# Altium integrated library 集成库Integrated_Library1.IntLib: 86 symbols
Pins are listed as number, name and electrical type; pins without a type are passive.

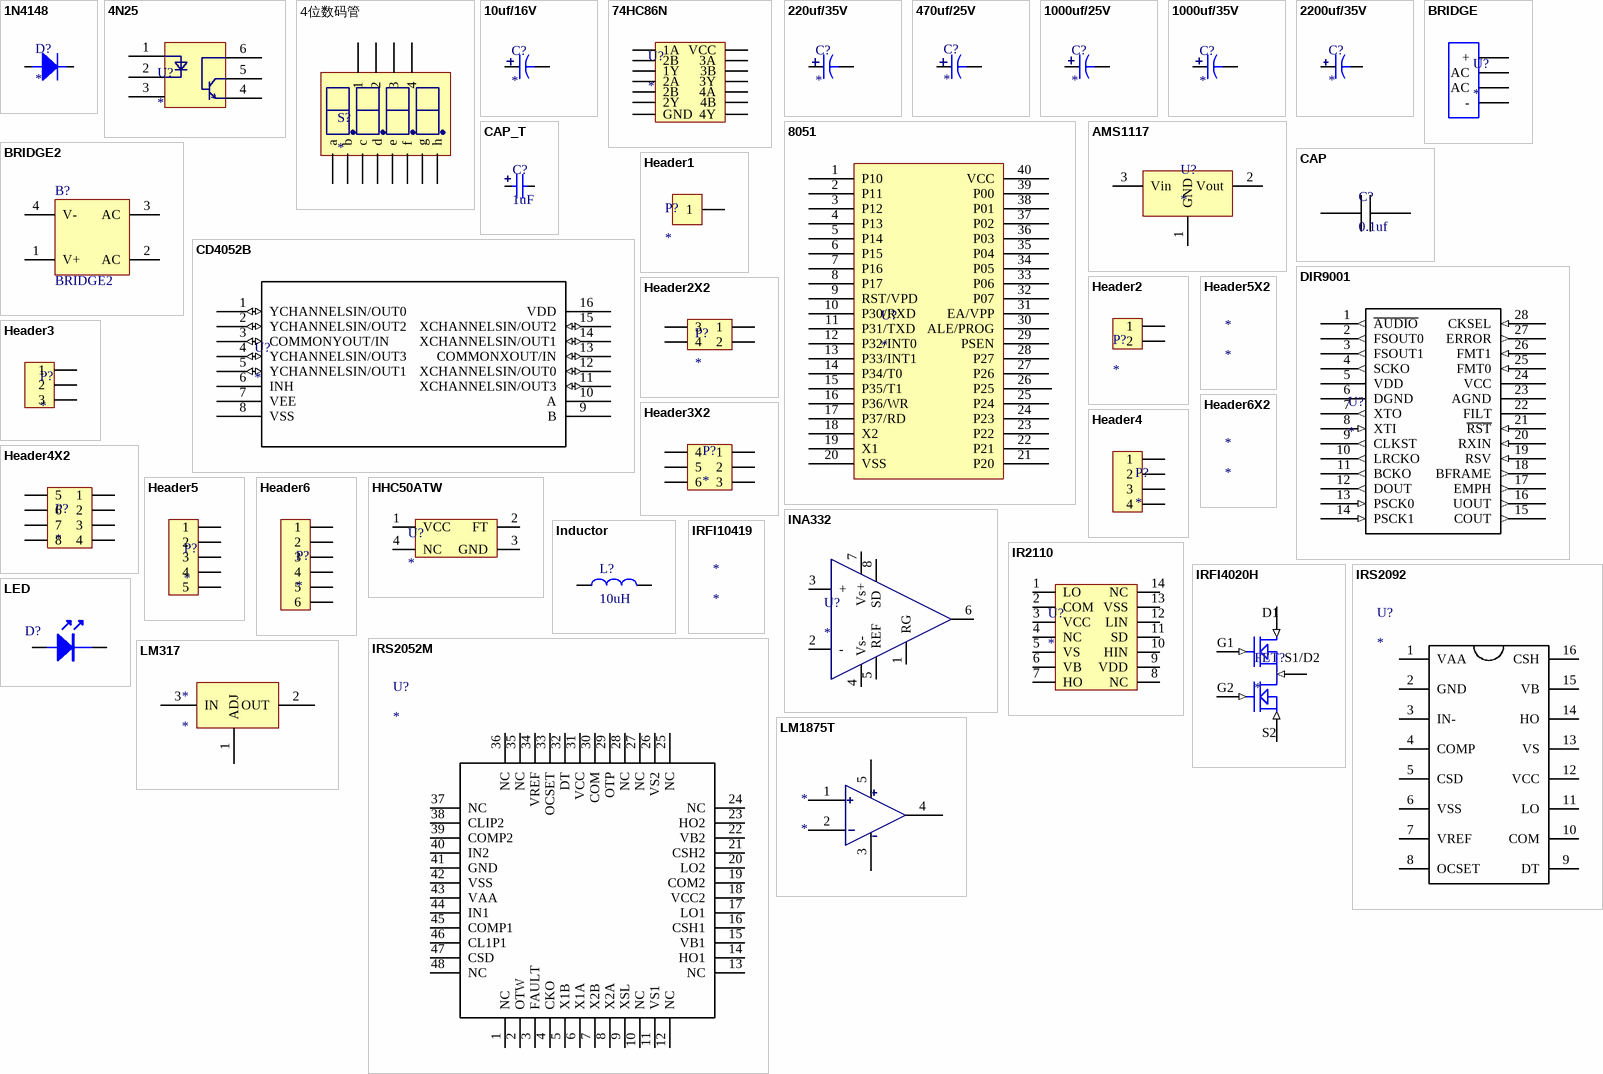
[diagram p0: symbols 1N4148 to LM1875T]

## 1N4148
designator D?
footprint DIODE
pins: 1 A, 2 K

## 4N25
designator U?
footprint 4N25 - duplicate
pins: 1, 2, 3, 4, 5, 6

## 4位数码管
designator S?
footprint 4位数码管
pins: 1, 2 a, 3 f, 4 2, 5 3, 6 b, 7 4, 8 g, 9 c, 10 h, 11 d, 12 e

## 10uf/16V
designator C?
footprint 100uf/35V
3D model 电解电容__深绿__零件72 (PCB3D Model)
pins: 1, 2

## 74HC86N
designator U?
footprint 74HC86N-DIP14
pins: 1 1A, 2 2B, 3 1Y, 4 2A, 5 2B, 6 2Y, 7 GND, 8 4Y, 9 4B, 10 4A, 11 3Y, 12 3B, 13 3A, 14 VCC

## 220uf/35V
designator C?
footprint 100uf/35V
pins: 1, 2

## 470uf/25V
designator C?
footprint 470uf/25V
pins: 1, 2

## 1000uf/25V
designator C?
footprint 1000uf/35V
pins: 1, 2

## 1000uf/35V
designator C?
footprint 1000uf/35V
pins: 1, 2

## 2200uf/35V
designator C?
footprint 2200uf/35V
pins: 1, 2

## 8051
designator U?
footprint 80C51
pins: 1 P10, 2 P11, 3 P12, 4 P13, 5 P14, 6 P15, 7 P16, 8 P17, 9 RST/VPD, 10 P30/RXD, 11 P31/TXD, 12 P32/INT0, 13 P33/INT1, 14 P34/T0, 15 P35/T1, 16 P36/WR, 17 P37/RD, 18 X2, 19 X1, 20 VSS, 21 P20, 22 P21, 23 P22, 24 P23, 25 P24, 26 P25, 27 P26, 28 P27, 29 PSEN, 30 ALE/PROG, 31 EA/VPP, 32 P07, 33 P06, 34 P05, 35 P04, 36 P03, 37 P02, 38 P01, 39 P00, 40 VCC

## AMS1117
designator U?
3.3V电压转换器AMS1117
footprint ASM1117
pins: 1 GND, 2 Vout, 3 Vin

## BRIDGE
designator U?
pins: 1 AC, 2 AC, 3 +, 4 -

## BRIDGE2
designator B?
Diode Bridge
footprint BRIDGE
pins: 1 V+, 2 AC, 3 AC, 4 V-
2 alternate drawings of the same symbol

## CAP
designator C?, comment 0.1uf
value: 0.1uf
footprint 0805-CAP
footprint 0603-cap
pins: 1, 2

## CAP_T
designator C?, comment 1uF
footprint CAP-C
footprint CAP-C
footprint CAP-A
pins: 1, 2

## CD4052B
designator U?
footprint D16-M
pins: 1 YCHANNELSIN/OUT0 (io), 2 YCHANNELSIN/OUT2 (io), 3 COMMONYOUT/IN (io), 4 YCHANNELSIN/OUT3 (io), 5 YCHANNELSIN/OUT1 (io), 6 INH, 7 VEE (power), 8 VSS (power), 9 B, 10 A, 11 XCHANNELSIN/OUT3 (io), 12 XCHANNELSIN/OUT0 (io), 13 COMMONXOUT/IN (io), 14 XCHANNELSIN/OUT1 (io), 15 XCHANNELSIN/OUT2 (io), 16 VDD (power)

## DIR9001
designator U?
footprint PW28
pins: 1 ~{AUDIO} (out), 2 FSOUT0 (out), 3 FSOUT1 (out), 4 SCKO (out), 5 VDD (power), 6 DGND (power), 7 XTO (out), 8 XTI (in), 9 CLKST (out), 10 LRCKO (out), 11 BCKO (out), 12 DOUT (out), 13 PSCK0 (in), 14 PSCK1 (in), 15 COUT (out), 16 UOUT (out), 17 EMPH (out), 18 BFRAME (out), 19 RSV (in), 20 RXIN (in), 21 ~{RST} (in), 22 FILT, 23 AGND (power), 24 VCC (power), 25 FMT0 (in), 26 FMT1 (in), 27 ERROR (out), 28 CKSEL (in)

## Header1
designator P?
pins: 1

## Header2
designator P?
footprint header2
pins: 1, 2

## Header2X2
designator P?
footprint header2x2
pins: 1, 2, 3, 4

## Header3
designator P?
footprint header3
pins: 1, 2, 3

## Header3X2
designator P?
footprint header2x3
pins: 1, 2, 3, 4, 5, 6

## Header4
designator P?
footprint header4
pins: 1, 2, 3, 4

## Header4X2
designator P?
footprint HEADER2X4
pins: 1, 2, 3, 4, 5, 6, 7, 8

## Header5
designator P?
footprint header5
pins: 1, 2, 3, 4, 5

## Header5X2
designator *

## Header6
designator P?
footprint Header6
pins: 1, 2, 3, 4, 5, 6

## Header6X2
designator *

## HHC50ATW
designator U?
footprint 24.576M
pins: 1 VCC, 2 FT, 3 GND, 4 NC

## INA332
designator U?
footprint DGK8
pins: 1 RG, 2 -, 3 +, 4 Vs-, 5 REF, 6, 7 Vs+, 8 SD

## Inductor
designator L?, comment 10uH
footprint 0805L
footprint 0603_L
footprint 7G17A
pins: 1, 2

## IR2110
designator U?
footprint Model Name (Model Description)
footprint IR2110-DIP
pins: 1 LO, 2 COM, 3 VCC, 4 NC, 5 VS, 6 VB, 7 HO, 8 NC, 9 VDD, 10 HIN, 11 SD, 12 LIN, 13 VSS, 14 NC

## IRFI4020H
designator FET?
footprint IRFI14020H-117P
pins: 1 G2 (in), 2 G1 (in), 3 S2 (in), 4 S1/D1 (in), 5 D1 (in)
text: S1/D2

## IRFI10419
designator *

## IRS2052M
designator U?
pins: 1 NC, 2 OTW, 3 FAULT, 4 CKO, 5 X1B, 6 X1A, 7 X2B, 8 X2A, 9 XSL, 10 NC, 11 VS1, 12 NC, 13 NC, 14 HO1, 15 VB1, 16 CSH1, 17 LO1, 18 VCC2, 19 COM2, 20 LO2, 21 CSH2, 22 VB2, 23 HO2, 24 NC, 25 NC, 26 VS2, 27 NC, 28 NC, 29 OTP, 30 COM, 31 VCC, 32 DT, 33 OCSET, 34 VREF, 35 NC, 36 NC, 37 NC, 38 CLIP2, 39 COMP2, 40 IN2, 41 GND, 42 VSS, 43 VAA, 44 IN1, 45 COMP1, 46 CL1P1, 47 CSD, 48 NC

## IRS2092
designator U?
footprint IRS2092
pins: 1 VAA, 2 GND, 3 IN-, 4 COMP, 5 CSD, 6 VSS, 7 VREF, 8 OCSET, 9 DT, 10 COM, 11 LO, 12 VCC, 13 VS, 14 HO, 15 VB, 16 CSH

## LED
designator D?  (value not drawn)
footprint 0805_LED
footprint LEDDIP
footprint 0603_LED
pins: 1 A, 2 K

## LM317
designator *
footprint LM317
pins: 1 ADJ, 2 OUT, 3 IN

## LM1875T
designator *
footprint LM1875
footprint LM1875
pins: 1, 2, 3, 4, 5

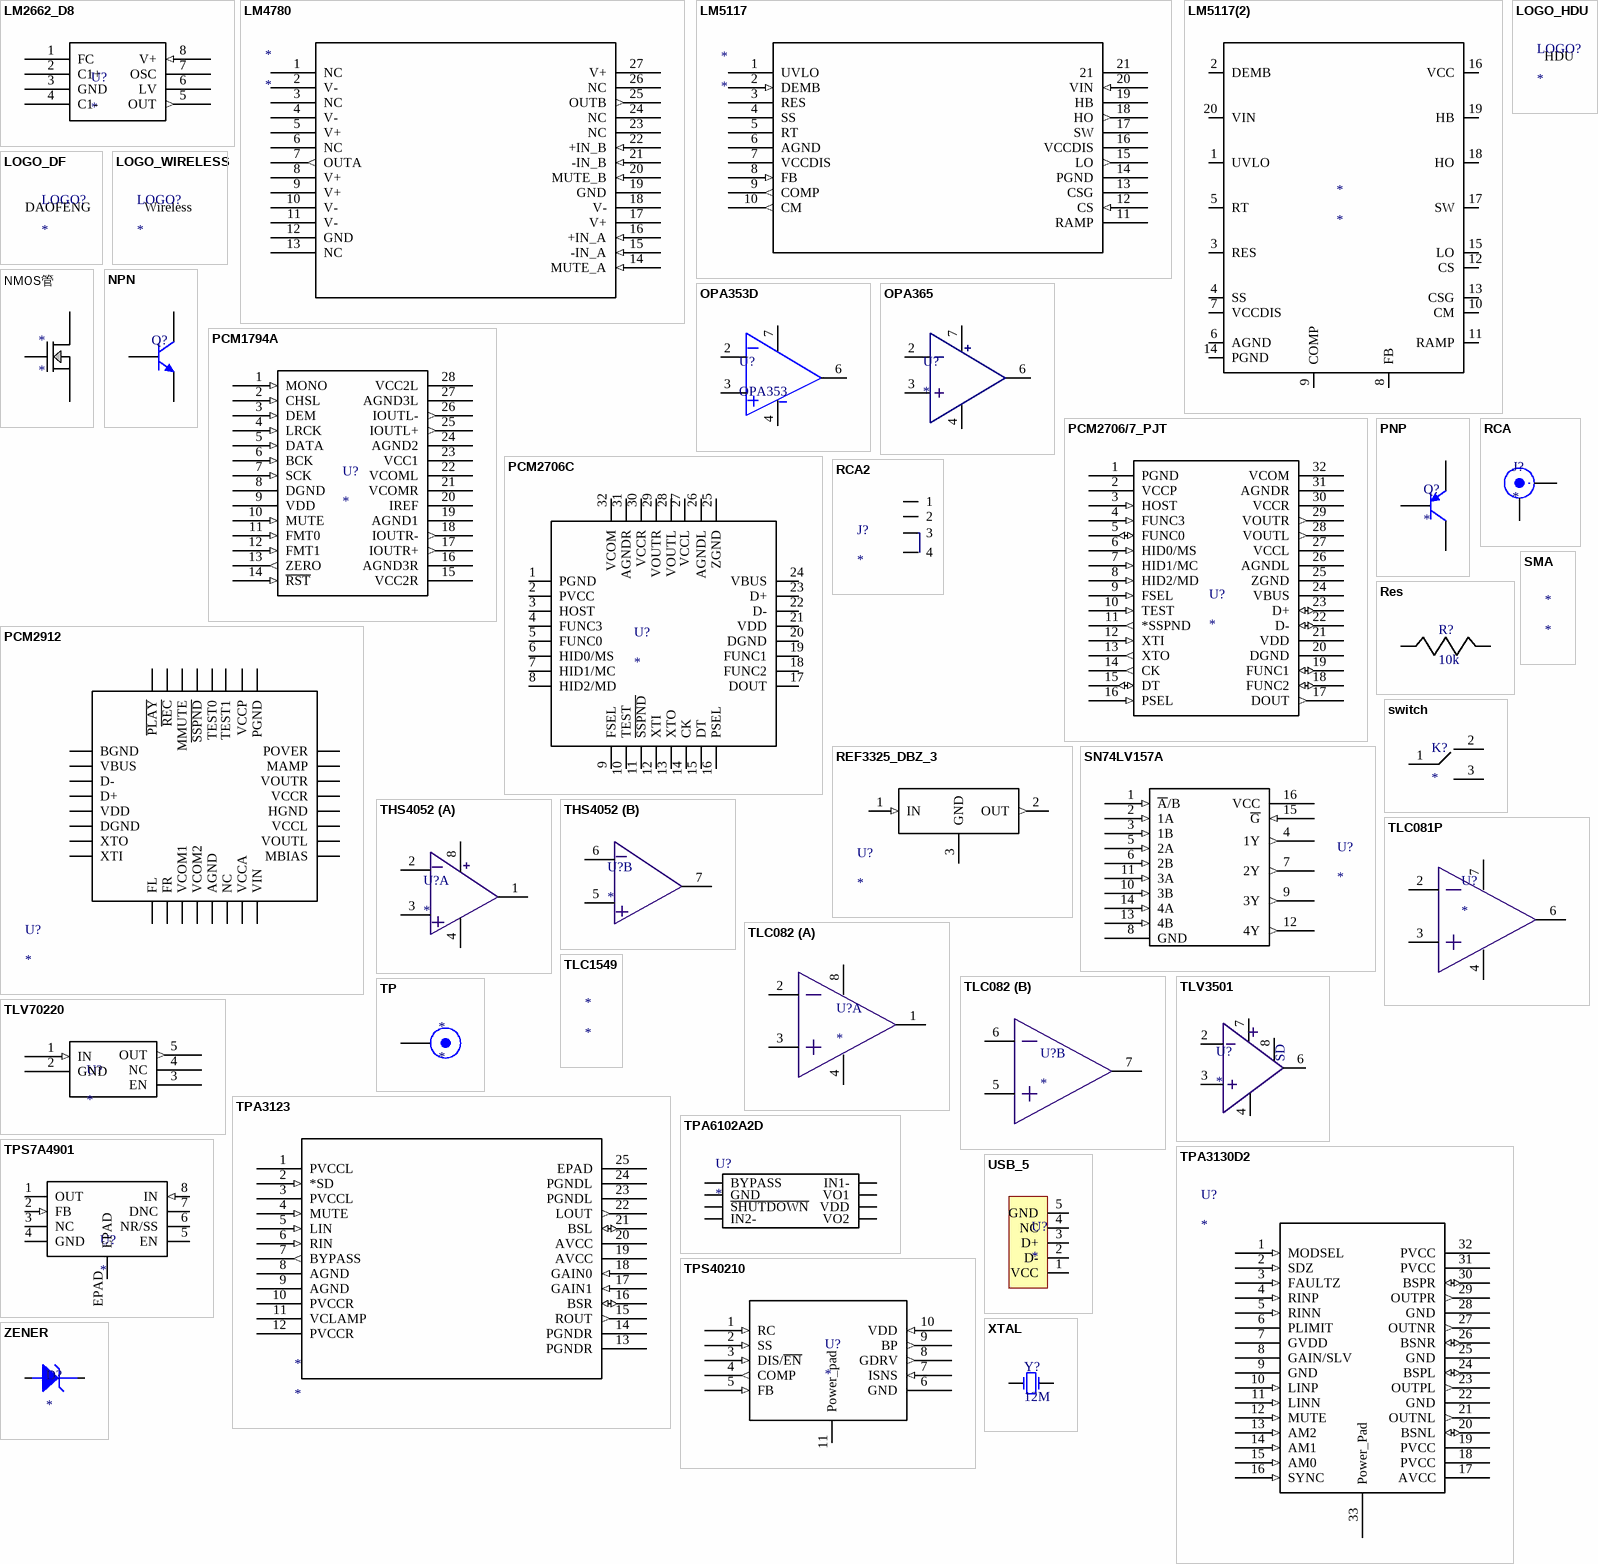
[diagram p1: symbols LM2662_D8 to ZENER]

## LM2662_D8
designator U?
footprint M08A
pins: 1 FC, 2 C1+, 3 GND, 4 C1-, 5 OUT (out), 6 LV, 7 OSC, 8 V+ (in)

## LM4780
designator *
footprint LM4780
pins: 1 NC, 2 V- (power), 3 NC, 4 V- (power), 5 V+ (power), 6 NC, 7 OUTA (out), 8 V+ (power), 9 V+ (power), 10 V- (power), 11 V- (power), 12 GND (power), 13 NC, 14 MUTE_A (in), 15 -IN_A (in), 16 +IN_A (in), 17 V+ (power), 18 V- (power), 19 GND (power), 20 MUTE_B (in), 21 -IN_B (in), 22 +IN_B (in), 23 NC, 24 NC, 25 OUTB (out), 26 NC, 27 V+ (power)

## LM5117
designator *
footprint LM5117
pins: 1 UVLO, 2 DEMB (in), 3 RES, 4 SS, 5 RT, 6 AGND (power), 7 VCCDIS (power), 8 FB (in), 9 COMP (out), 10 CM (out), 11 RAMP, 12 CS (in), 13 CSG, 14 PGND (power), 15 LO (out), 16 VCCDIS (power), 17 SW, 18 HO (out), 19 HB, 20 VIN (in), 21

## LM5117(2)
designator *
footprint LM5117
pins: 1 UVLO, 2 DEMB, 3 RES, 4 SS, 5 RT, 6 AGND, 7 VCCDIS, 8 FB, 9 COMP, 10 CM, 11 RAMP, 12 CS, 13 CSG, 14 PGND, 15 LO, 16 VCC, 17 SW, 18 HO, 19 HB, 20 VIN, 21 PGND

## LOGO_DF
designator LOGO?
footprint LOGO_DF
text: DAOFENG

## LOGO_HDU
designator LOGO?
footprint LOGO_HDU
text: HDU

## LOGO_WIRELESS
designator LOGO?
footprint logo_wireless
text: Wireless

## NMOS管
designator *
footprint TO-220
pins: 1 Gate, 2 Drain, 2 Drain, 3 Source, 5 Drain, 6 Drain, 7 Source, 8 Drain

## NPN
designator Q?  (value not drawn)
footprint MBT5551-NPN
footprint NPN
footprint BJT
pins: 1 B, 2 E, 3 C

## OPA353D
designator U?, comment OPA353
footprint D8
pins: 2, 3, 4, 6, 7

## OPA365
designator U?
footprint OPA365
pins: 2, 3, 4, 6, 7

## PCM1794A
designator U?
footprint DB28
pins: 1 MONO (in), 2 CHSL (in), 3 DEM (in), 4 LRCK (in), 5 DATA (in), 6 BCK (in), 7 SCK (in), 8 DGND (power), 9 VDD (power), 10 MUTE (in), 11 FMT0 (in), 12 FMT1 (in), 13 ZERO (out), 14 ~{RST} (in), 15 VCC2R (power), 16 AGND3R (power), 17 IOUTR+ (out), 18 IOUTR- (out), 19 AGND1 (power), 20 IREF (power), 21 VCOMR (power), 22 VCOML (power), 23 VCC1 (power), 24 AGND2 (power), 25 IOUTL+ (out), 26 IOUTL- (out), 27 AGND3L (power), 28 VCC2L (power)

## PCM2706/7_PJT
designator U?
footprint PJT32
pins: 1 PGND (power), 2 VCCP (power), 3 HOST (in), 4 FUNC3 (in), 5 FUNC0 (io), 6 HID0/MS (in), 7 HID1/MC (in), 8 HID2/MD (in), 9 FSEL (in), 10 TEST (in), 11 *SSPND (out), 12 XTI (in), 13 XTO (out), 14 CK (out), 15 DT (io), 16 PSEL (in), 17 DOUT (out), 18 FUNC2 (io), 19 FUNC1 (io), 20 DGND (power), 21 VDD (power), 22 D- (io), 23 D+ (io), 24 VBUS (power), 25 ZGND (power), 26 AGNDL (power), 27 VCCL (power), 28 VOUTL (out), 29 VOUTR (out), 30 VCCR (power), 31 AGNDR (power), 32 VCOM (power)

## PCM2706C
designator U?
footprint PCM2912
pins: 1 PGND, 2 PVCC, 3 HOST, 4 FUNC3, 5 FUNC0, 6 HID0/MS, 7 HID1/MC, 8 HID2/MD, 9 FSEL, 10 TEST, 11 ~{SSPND}, 12 XTI, 13 XTO, 14 CK, 15 DT, 16 PSEL, 17 DOUT, 18 FUNC2, 19 FUNC1, 20 DGND, 21 VDD, 22 D-, 23 D+, 24 VBUS, 25 ZGND, 26 AGNDL, 27 VCCL, 28 VOUTL, 29 VOUTR, 30 VCCR, 31 AGNDR, 32 VCOM

## PCM2912
designator U?
footprint PCM2912
pins: 1 BGND, 2 VBUS, 3 D-, 4 D+, 5 VDD, 6 DGND, 7 XTO, 8 XTI, 9 FL, 10 FR, 11 VCOM1, 12 VCOM2, 13 AGND, 14 NC, 15 VCCA, 16 VIN, 17 MBIAS, 18 VOUTL, 19 VCCL, 20 HGND, 21 VCCR, 22 VOUTR, 23 MAMP, 24 POVER, 25 PGND, 26 VCCP, 27 TEST1, 28 TEST0, 29 ~{SSPND}, 30 MMUTE, 31 ~{REC}, 32 ~{PLAY}

## PNP
designator Q?
footprint MMBT5401-PNP
footprint PNP
footprint PNP
footprint BJT
pins: 1 B, 2 E, 3 C

## RCA
designator J?
footprint RCA
pins: 1, 2

## RCA2
designator J?
footprint RCA2
pins: 1, 2, 3, 4

## REF3325_DBZ_3
designator U?
footprint DBZ3
pins: 1 IN (in), 2 OUT (out), 3 GND

## Res
designator R?, comment 10k
value: 10k
footprint 0805-Res
footprint 0603-res
footprint Res
pins: 1, 2

## SMA
designator *

## SN74LV157A
designator U?
footprint D16
pins: 1 ~{A}/B (in), 2 1A (in), 3 1B (in), 4 1Y (out), 5 2A (in), 6 2B (in), 7 2Y (out), 8 GND (power), 9 3Y (out), 10 3B (in), 11 3A (in), 12 4Y (out), 13 4B (in), 14 4A (in), 15 ~{G} (in), 16 VCC (power)

## switch
designator K?
footprint switch
pins: 1, 2, 3

## THS4052
designator U?
footprint D8
part A pins: 1, 2, 3, 4, 8
part B pins: 5, 6, 7

## TLC081P
designator U?
footprint DIP8 - duplicate
footprint D8M
pins: 2, 3, 4, 6, 7

## TLC082
designator U?
footprint D8M
part A pins: 1, 2, 3, 4, 8
part B pins: 5, 6, 7

## TLC1549
designator *

## TLV3501
designator U?
footprint TLV3501
pins: 2, 3, 4, 6, 7, 8
text: SD

## TLV70220
designator U?
footprint DBV5
pins: 1 IN (in), 2 GND (power), 3 EN, 4 NC, 5 OUT (out)

## TP
designator *
footprint 定位孔 Φ3 1
pins: 1

## TPA3123
designator *
footprint TPA3123
pins: 1 PVCCL (power), 2 *SD (in), 3 PVCCL (power), 4 MUTE (in), 5 LIN (in), 6 RIN (in), 7 BYPASS (out), 8 AGND (power), 9 AGND (power), 10 PVCCR (power), 11 VCLAMP (power), 12 PVCCR (power), 13 PGNDR (power), 14 PGNDR (power), 15 ROUT (out), 16 BSR (io), 17 GAIN1 (in), 18 GAIN0 (in), 19 AVCC (power), 20 AVCC (power), 21 BSL (io), 22 LOUT (out), 23 PGNDL (power), 24 PGNDL (power), 25 EPAD

## TPA3130D2
designator U?
footprint THSSOP32
pins: 1 MODSEL (in), 2 SDZ (in), 3 FAULTZ (in), 4 RINP (in), 5 RINN (in), 6 PLIMIT, 7 GVDD (power), 8 GAIN/SLV (power), 9 GND, 10 LINP (in), 11 LINN (in), 12 MUTE (in), 13 AM2 (in), 14 AM1 (in), 15 AM0 (in), 16 SYNC (in), 17 AVCC, 18 PVCC, 19 PVCC (power), 20 BSNL (io), 21 OUTNL (out), 22 GND, 23 OUTPL (out), 24 BSPL (io), 25 GND, 26 BSNR (io), 27 OUTNR (out), 28 GND (power), 29 OUTPR (out), 30 BSPR (io), 31 PVCC, 32 PVCC, 33 Power_Pad

## TPA6102A2D
designator U?
footprint SOIC8
pins: 1 BYPASS, 2 GND, 3 ~{SHUTDOWN}, 4 IN2-, 5 VO2, 6 VDD, 7 VO1, 8 IN1-

## TPS7A4901
designator U?
footprint DGN8_1P89x1P57
pins: 1 OUT, 2 FB (in), 3 NC, 4 GND (power), 5 EN, 6 NR/SS, 7 DNC, 8 IN (in), EPAD

## TPS40210
designator U?
footprint DGQ10_1P88X1P57
pins: 1 RC (in), 2 SS (in), 3 DIS/~{EN} (in), 4 COMP (out), 5 FB (in), 6 GND (power), 7 ISNS (in), 8 GDRV (out), 9 BP (out), 10 VDD (in), 11 Power_pad

## USB_5
designator U?
footprint USB/SM0.8-6H5
pins: 1 VCC, 2 D-, 3 D+, 4 NC, 5 GND

## XTAL
designator Y?, comment 12M
footprint XTAL_US
pins: 1 OSC1, 2 OSC2

## ZENER
designator D?
footprint ZENER
pins: 1 A, 2 K

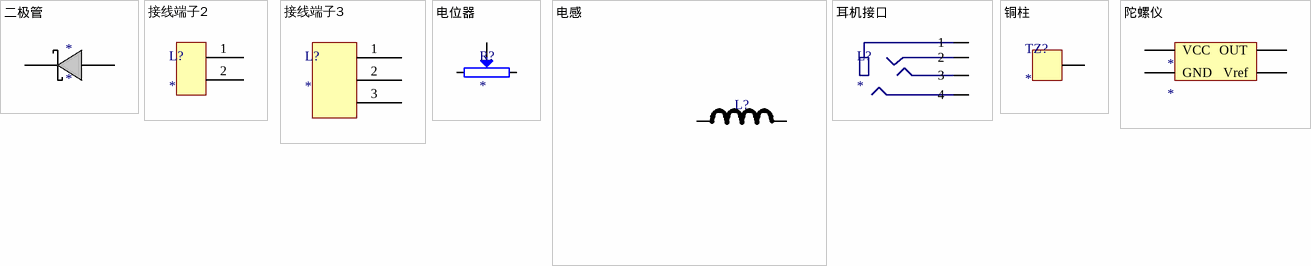
[diagram p2: symbols 二极管 to 陀螺仪]

## 二极管
designator *
footprint 二极管
pins: 1 K, 2 A

## 接线端子2
designator L?
footprint 接线端子2
pins: 1, 2

## 接线端子3
designator L?
footprint 接线端子3
pins: 1, 2, 3

## 电位器
designator R?
footprint 电位器1
pins: 1, 2, 3

## 电感
designator L?  (value not drawn)
footprint 电感
footprint L_6R8
pins: 1, 2

## 耳机接口
designator L?
footprint PJ322
pins: 1, 2, 3, 4

## 铜柱
designator TZ?
footprint TZ
pins: 1

## 陀螺仪
designator *
footprint 陀螺仪
pins: 1 VCC, 2 GND, 3 Vref, 4 OUT